# Altium footprint library DipComponent.PcbLib: 303 footprints (part 5 of 19)
Each footprint in its own frame and in the unit in brackets; x right, y up, seen from the top. Pads: shape width x height; smd on the part's side, far side on the other; paste and mask are expansions set on the pad; w line width, h text height; cw(c..) or ccw(c..) is an arc to the next point about the centre after c.
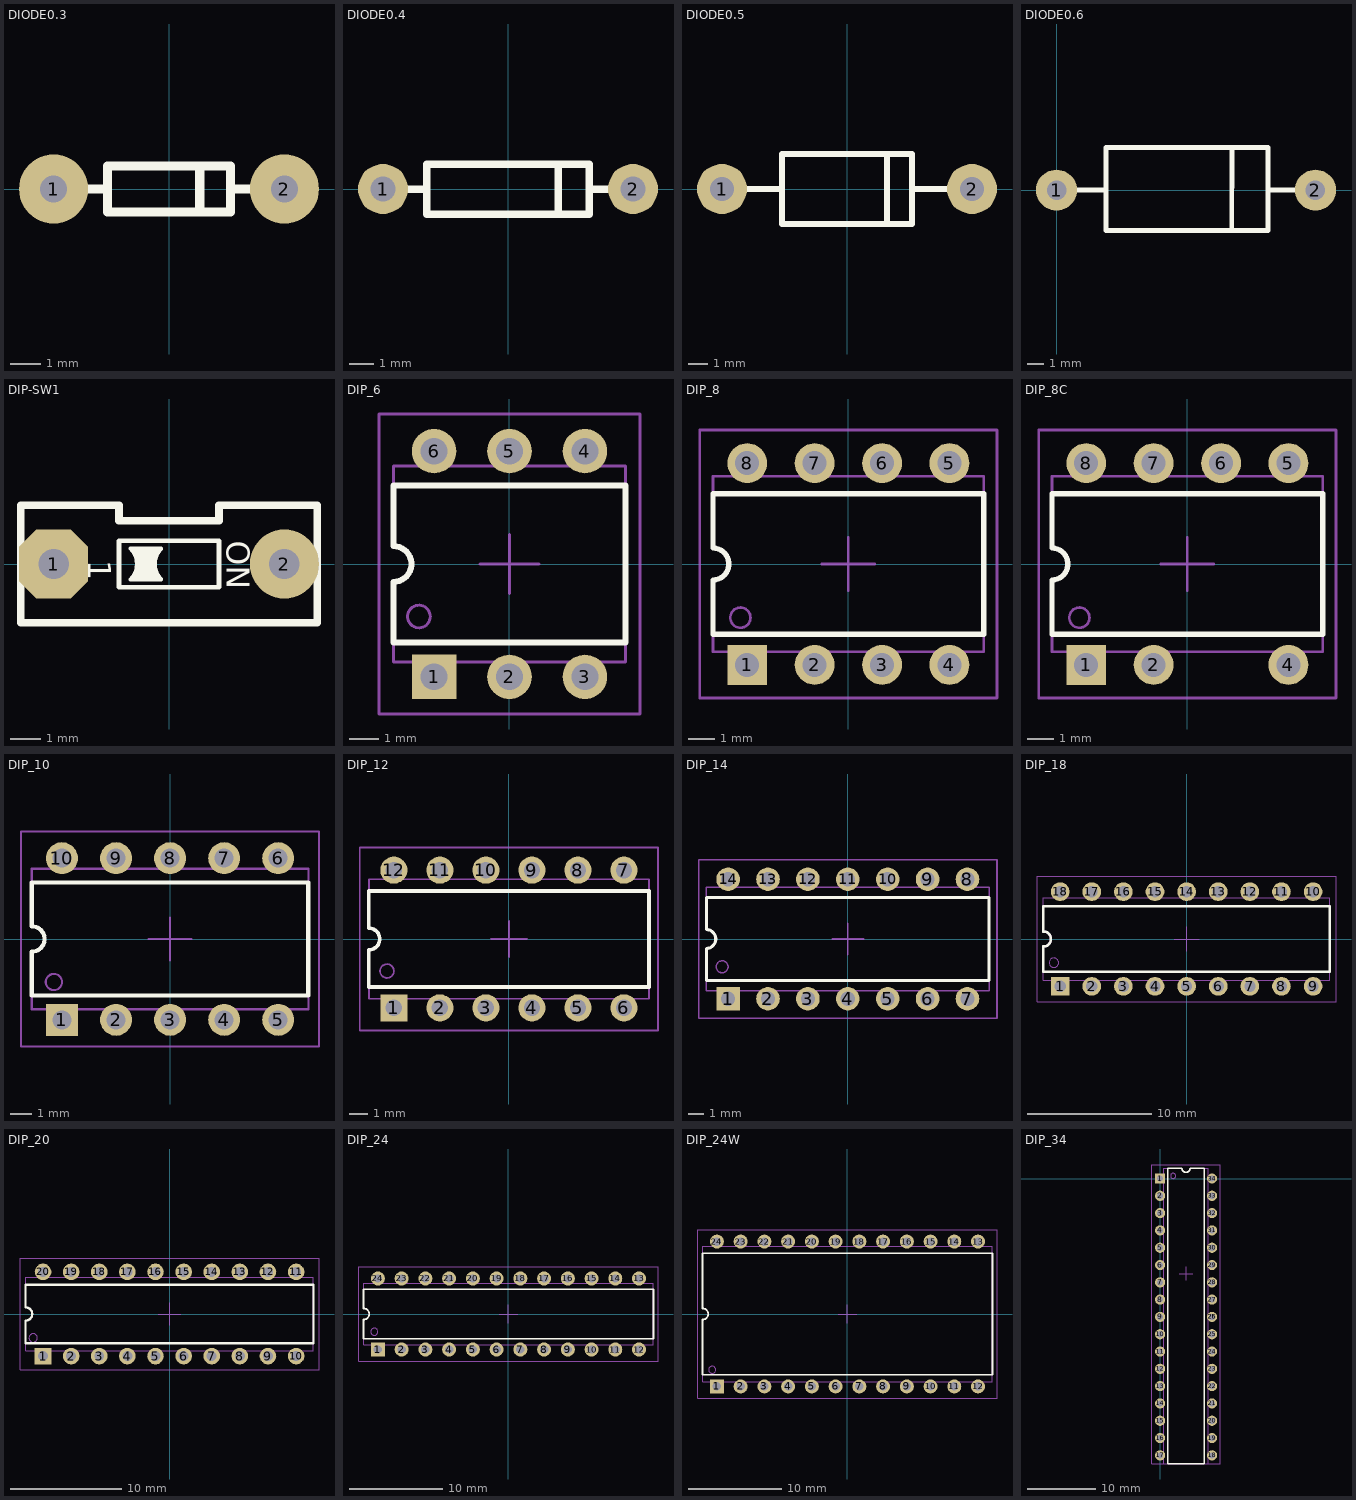
[diagram p4: the footprints below, top view; thin cyan lines are the x and y axes]

## DIODE0.3 [mil]
pads (2):
  round 90 hole 35.43: 1(-150,0) 2(150,0)
Top Overlay:
  lines w12: -110,0 -80,0 ; 40,-30 40,30 ; 80,0 110,0 ; -80,-30 -80,30 80,30 80,-30 -80,-30

## DIODE0.4 [mil]
pads (2):
  round 80 hole 39.37: 1(-200,0) 2(200,0)
Top Overlay:
  lines w12: -160,0 -130,0 ; 80,-40 80,40 ; 130,0 160,0 ; -130,-40 130,-40 130,40 -130,40 -130,-40

## DIODE0.5 [mm]
pads (2):
  round 2.54 hole 1.2: 1(-6.35,0) 2(6.35,0)
Top Overlay:
  lines w0.305: -5.207,0 -3.302,0 ; 2.032,-1.778 2.032,1.778 ; 3.302,0 5.207,0 ; -3.302,-1.778 -3.302,1.778 3.302,1.778 3.302,-1.778 -3.302,-1.778
3D body "Diod DO-201AD Horizontal.STEP": height 5.8, standoff -3.3, extent -7.589,-2.811 7.701,2.799

## DIODE0.6 [mm]
pads (2):
  round 2.54 hole 1.2: 1(0,0) 2(16,0)
Top Overlay:
  lines w0.305: 1.143,0 3.048,0 ; 10.829,-2.461 10.83,2.64 ; 13.091,0 16,0 ; 3.048,-2.499 13.072,-2.499 13.072,2.632 3.048,2.632 3.048,-2.499
3D body "Diod DO-201AD Horizontal.STEP": height 5.8, standoff -3.3, extent 0.386,-2.862 15.676,2.748

## DIP-SW1 [mil]
pads (2):
  oct 90x90 hole 39.37: 1(-150,0)
  round 90 hole 39.37: 2(150,0)
Top Overlay:
  lines w5: -31,-9 -29,4 -32,8 -25,8 -29,-3 -25,-10 -35,-10 -31,0 -36,11 -21,11 -26,-1 -20,-13 -40,-13 -34,2 -41,14 -17,14 -22,-1 -16,-17 -44,-17 -38,3 -45,17 -14,17 ; -50,-20 ccw(c-70,0) -50,20 -10,20 ccw(c10,0) -10,-20 -50,-20
  lines w6: -64.96,-30 -64.96,30 64.96,30 64.96,-30 -64.96,-30
  lines w10: -192.91,-76.38 192.91,-76.38 192.91,76.38 64.96,76.38 64.96,56.38 -64.96,56.38 -64.96,76.38 -192.91,76.38 -192.91,-76.38
  text "ON" at 75,30 h30
  text "1" at -105,5 h30

## DIP_6 [mm] "DIP6"
height 5.06
pads (6):
  rect 1.5x1.5 hole 0.9: 1(-2.54,-3.8)
  round 1.5 hole 0.9: 2(0,-3.8) 3(2.54,-3.8) 4(2.54,3.8) 5(0,3.8) 6(-2.54,3.8)
Top Overlay:
  lines w0.2: -3.9,-2.65 -3.9,-0.6 ccw(c-3.9,0) -3.9,0.6 -3.9,2.65 3.9,2.65 3.9,-2.65 -3.9,-2.65
Mechanical 13:
  circle w0.1: c-3.048,-1.768 r0.381
  lines w0.1: -3.9,-3.3 3.9,-3.3 3.9,3.3 -3.9,3.3 -3.9,0.6 cw(c-3.9,0) -3.9,-0.6 -3.9,-3.3
Mechanical 15:
  lines w0.1: -1,0 1,0 ; 0,-1 0,1 ; -4.4,-5.05 4.4,-5.05 4.4,5.05 -4.4,5.05 -4.4,-5.05
3D body: height 5.06, standoff 0, extent -3.9,-3.3 3.9,3.3

## DIP_8 [mm] "Dual-In-line Package,300mil body;8 pin"
height 5.06
pads (8):
  rect 1.5x1.5 hole 0.9: 1(-3.81,-3.8)
  round 1.5 hole 0.9: 2(-1.27,-3.8) 3(1.27,-3.8) 4(3.81,-3.8) 5(3.81,3.8) 6(1.27,3.8) 7(-1.27,3.8) 8(-3.81,3.8)
Top Overlay:
  lines w0.2: -5.1,-2.65 5.1,-2.65 5.1,2.65 -5.1,2.65 -5.1,0.6 cw(c-5.1,0) -5.1,-0.6 -5.1,-2.65
Mechanical 13:
  circle w0.1: c-4.064,-2.022 r0.381
  lines w0.1: -5.1,-3.3 -5.1,-0.6 ccw(c-5.1,0) -5.1,0.6 -5.1,3.3 5.1,3.3 5.1,-3.3 -5.1,-3.3
Mechanical 15:
  lines w0.1: -1,0 1,0 ; 0,-1 0,1 ; -5.6,-5.05 5.6,-5.05 5.6,5.05 -5.6,5.05 -5.6,-5.05
3D body: height 5.06, standoff 0, extent -5.1,-3.3 5.1,3.3

## DIP_8C [mm] "Dual-In-line Package,300mil body;8 pin"
height 5.06
pads (7):
  rect 1.5x1.5 hole 0.9: 1(-3.81,-3.8)
  round 1.5 hole 0.9: 2(-1.27,-3.8) 4(3.81,-3.8) 5(3.81,3.8) 6(1.27,3.8) 7(-1.27,3.8) 8(-3.81,3.8)
Top Overlay:
  lines w0.2: -5.1,-2.65 -5.1,-0.6 ccw(c-5.1,0) -5.1,0.6 -5.1,2.65 5.1,2.65 5.1,-2.65 -5.1,-2.65
Mechanical 13:
  circle w0.1: c-4.064,-2.022 r0.381
  lines w0.1: -5.1,-3.3 5.1,-3.3 5.1,3.3 -5.1,3.3 -5.1,0.6 cw(c-5.1,0) -5.1,-0.6 -5.1,-3.3
Mechanical 15:
  lines w0.1: -1,0 1,0 ; 0,-1 0,1 ; -5.6,-5.05 -5.6,5.05 5.6,5.05 5.6,-5.05 -5.6,-5.05
3D body: height 5.06, standoff 0, extent -5.1,-3.3 5.1,3.3

## DIP_10 [mm] "Dual-In-line Package,300mil body;10 pin"
height 5.06
pads (10):
  rect 1.5x1.5 hole 0.9: 1(-5.08,-3.8)
  round 1.5 hole 0.9: 2(-2.54,-3.8) 3(0,-3.8) 4(2.54,-3.8) 5(5.08,-3.8) 6(5.08,3.8) 7(2.54,3.8) 8(0,3.8) 9(-2.54,3.8) 10(-5.08,3.8)
Top Overlay:
  lines w0.2: -6.5,-2.65 -6.5,-0.6 ccw(c-6.5,0) -6.5,0.6 -6.5,2.65 6.5,2.65 6.5,-2.65 -6.5,-2.65
Mechanical 13:
  circle w0.1: c-5.461,-2.022 r0.381
  lines w0.1: -6.5,-3.3 6.5,-3.3 6.5,3.3 -6.5,3.3 -6.5,0.6 cw(c-6.5,0) -6.5,-0.6 -6.5,-3.3
Mechanical 15:
  lines w0.1: -1,0 1,0 ; 0,-1 0,1 ; -7,-5.05 7,-5.05 7,5.05 -7,5.05 -7,-5.05
3D body: height 5.06, standoff 0, extent -6.5,-3.3 6.5,3.3

## DIP_12 [mm] "Dual-In-line Package,300mil body;12 pin"
height 5.06
pads (12):
  rect 1.5x1.5 hole 0.9: 1(-6.35,-3.8)
  round 1.5 hole 0.9: 2(-3.81,-3.8) 3(-1.27,-3.8) 4(1.27,-3.8) 5(3.81,-3.8) 6(6.35,-3.8) 7(6.35,3.8) 8(3.81,3.8) 9(1.27,3.8) 10(-1.27,3.8) 11(-3.81,3.8) 12(-6.35,3.8)
Top Overlay:
  lines w0.2: -7.73,-2.65 7.73,-2.65 7.73,2.65 -7.73,2.65 -7.73,0.6 cw(c-7.73,0) -7.73,-0.6 -7.73,-2.65
Mechanical 13:
  circle w0.1: c-6.731,-1.768 r0.381
  lines w0.1: -7.73,-3.3 -7.73,-0.6 ccw(c-7.73,0) -7.73,0.6 -7.73,3.3 7.73,3.3 7.73,-3.3 -7.73,-3.3
Mechanical 15:
  lines w0.1: -1,0 1,0 ; 0,-1 0,1 ; -8.23,-5.05 8.23,-5.05 8.23,5.05 -8.23,5.05 -8.23,-5.05
3D body: height 5.06, standoff 0, extent -7.73,-3.3 7.73,3.3

## DIP_14 [mm] "Dual-In-line Package,300mil body;14 pin"
height 5.06
pads (14):
  rect 1.5x1.5 hole 0.9: 1(-7.62,-3.8)
  round 1.5 hole 0.9: 2(-5.08,-3.8) 3(-2.54,-3.8) 4(0,-3.8) 5(2.54,-3.8) 6(5.08,-3.8) 7(7.62,-3.8) 8(7.62,3.8) 9(5.08,3.8) 10(2.54,3.8) 11(0,3.8) 12(-2.54,3.8) 13(-5.08,3.8) 14(-7.62,3.8)
Top Overlay:
  lines w0.2: -9,-2.65 9,-2.65 9,2.65 -9,2.65 -9,0.6 cw(c-9,0) -9,-0.6 -9,-2.65
Mechanical 13:
  circle w0.1: c-8.001,-1.768 r0.381
  lines w0.1: -9,-3.3 -9,-0.6 ccw(c-9,0) -9,0.6 -9,3.3 9,3.3 9,-3.3 -9,-3.3
Mechanical 15:
  lines w0.1: -1,0 1,0 ; 0,-1 0,1 ; -9.5,-5.05 9.5,-5.05 9.5,5.05 -9.5,5.05 -9.5,-5.05
3D body: height 5.06, standoff 0, extent -9,-3.3 9,3.3

## DIP_18 [mm] "Dual-In-line Package,300mil body;18 pin"
height 5.06
pads (18):
  rect 1.5x1.5 hole 0.9: 1(-10.16,-3.8)
  round 1.5 hole 0.9: 2(-7.62,-3.8) 3(-5.08,-3.8) 4(-2.54,-3.8) 5(0,-3.8) 6(2.54,-3.8) 7(5.08,-3.8) 8(7.62,-3.8) 9(10.16,-3.8) 10(10.16,3.8) 11(7.62,3.8) 12(5.08,3.8) 13(2.54,3.8) 14(0,3.8) 15(-2.54,3.8) 16(-5.08,3.8) 17(-7.62,3.8) 18(-10.16,3.8)
Top Overlay:
  lines w0.2: -11.5,-2.65 11.5,-2.65 11.5,2.65 -11.5,2.65 -11.5,0.6 cw(c-11.5,0) -11.5,-0.6 -11.5,-2.65
Mechanical 13:
  circle w0.1: c-10.668,-1.905 r0.381
  lines w0.1: -11.5,-0.6 -11.5,-3.3 11.5,-3.3 11.5,3.3 -11.5,3.3 -11.5,0.6
  lines w0.2: -11.5,-0.6 ccw(c-11.5,0) -11.5,0.6
Mechanical 15:
  lines w0.1: -1,0 1,0 ; 0,-1 0,1 ; -12,-5.05 -12,5.05 12,5.05 12,-5.05 -12,-5.05
3D body: height 5.06, standoff 0, extent -11.5,-3.3 11.5,3.3

## DIP_20 [mm] "Dual-In-line Package,300mil body;20 pin"
height 5.06
pads (20):
  rect 1.5x1.5 hole 0.9: 1(-11.43,-3.8)
  round 1.5 hole 0.9: 2(-8.89,-3.8) 3(-6.35,-3.8) 4(-3.81,-3.8) 5(-1.27,-3.8) 6(1.27,-3.8) 7(3.81,-3.8) 8(6.35,-3.8) 9(8.89,-3.8) 10(11.43,-3.8) 11(11.43,3.8) 12(8.89,3.8) 13(6.35,3.8) 14(3.81,3.8) 15(1.27,3.8) 16(-1.27,3.8) 17(-3.81,3.8) 18(-6.35,3.8) 19(-8.89,3.8) 20(-11.43,3.8)
Top Overlay:
  lines w0.2: -13,-2.65 -13,-0.6 ccw(c-13,0) -13,0.6 -13,2.65 13,2.65 13,-2.65 -13,-2.65
Mechanical 13:
  circle w0.1: c-12.319,-2.159 r0.381
  lines w0.1: -13,-3.3 -13,-0.6 ccw(c-13,0) -13,0.6 -13,3.3 13,3.3 13,-3.3 -13,-3.3
Mechanical 15:
  lines w0.1: -1,0 1,0 ; 0,-1 0,1 ; -13.5,-5.05 13.5,-5.05 13.5,5.05 -13.5,5.05 -13.5,-5.05
3D body: height 5.06, standoff 0, extent -13,-3.3 13,3.3

## DIP_24 [mm] "Dual-In-line Package,300mil body;24 pin"
height 5.06
pads (24):
  rect 1.5x1.5 hole 0.9: 1(-13.97,-3.8)
  round 1.5 hole 0.9: 2(-11.43,-3.8) 3(-8.89,-3.8) 4(-6.35,-3.8) 5(-3.81,-3.8) 6(-1.27,-3.8) 7(1.27,-3.8) 8(3.81,-3.8) 9(6.35,-3.8) 10(8.89,-3.8) 11(11.43,-3.8) 12(13.97,-3.8) 13(13.97,3.8) 14(11.43,3.8) 15(8.89,3.8) 16(6.35,3.8) 17(3.81,3.8) 18(1.27,3.8) 19(-1.27,3.8) 20(-3.81,3.8) 21(-6.35,3.8) 22(-8.89,3.8) 23(-11.43,3.8) 24(-13.97,3.8)
Top Overlay:
  lines w0.2: -15.5,-2.65 15.5,-2.65 15.5,2.65 -15.5,2.65 -15.5,0.6 cw(c-15.5,0) -15.5,-0.6 -15.5,-2.65
Mechanical 13:
  circle w0.1: c-14.351,-1.895 r0.381
  lines w0.1: -15.5,-3.3 -15.5,-0.6 ccw(c-15.5,0) -15.5,0.6 -15.5,3.3 15.5,3.3 15.5,-3.3 -15.5,-3.3
Mechanical 15:
  lines w0.1: -1,0 1,0 ; 0,-1 0,1 ; -16,-5.05 -16,5.05 16,5.05 16,-5.05 -16,-5.05
3D body: height 5.06, standoff 0, extent -15.5,-3.3 15.5,3.3

## DIP_24W [mm] "Dual-In-line Package,600mil body;24 pin"
height 5.06
pads (24):
  rect 1.5x1.5 hole 0.9: 1(-13.97,-7.75)
  round 1.5 hole 0.9: 2(-11.43,-7.75) 3(-8.89,-7.75) 4(-6.35,-7.75) 5(-3.81,-7.75) 6(-1.27,-7.75) 7(1.27,-7.75) 8(3.81,-7.75) 9(6.35,-7.75) 10(8.89,-7.75) 11(11.43,-7.75) 12(13.97,-7.75) 13(13.97,7.75) 14(11.43,7.75) 15(8.89,7.75) 16(6.35,7.75) 17(3.81,7.75) 18(1.27,7.75) 19(-1.27,7.75) 20(-3.81,7.75) 21(-6.35,7.75) 22(-8.89,7.75) 23(-11.43,7.75) 24(-13.97,7.75)
Top Overlay:
  lines w0.2: -15.5,-6.5 -15.5,-0.6 ccw(c-15.5,0) -15.5,0.6 -15.5,6.5 15.5,6.5 15.5,-6.5 -15.5,-6.5
Mechanical 13:
  circle w0.1: c-14.478,-5.969 r0.381
  lines w0.1: -15.5,-7.25 15.5,-7.25 15.5,7.25 -15.5,7.25 -15.5,0.6 cw(c-15.5,0) -15.5,-0.6 -15.5,-7.25
Mechanical 15:
  lines w0.1: -1,0 1,0 ; 0,-1 0,1 ; -16,-9 16,-9 16,9 -16,9 -16,-9
3D body: height 5.06, standoff 0, extent -15.5,-7.25 15.5,7.25

## DIP_34 [mm] "Dual-In-line Package,300mil body;24 pin"
height 5.06
pads (35):
  rect 1.5x1.5 hole 0.9: 1(0,0)
  round 1.5 hole 0.9: 2(0,-2.54) 3(0,-5.08) 4(0,-7.62) 5(0,-10.16) 6(0,-12.7) 7(0,-15.24) 8(0,-17.78) 9(0,-20.32) 10(0,-22.86) 11(0,-25.4) 12(0,-27.94) 13(0,-30.48) 14(0,-33.02) 15(0,-35.56) 16(0,-38.1) 17(0,-40.64) 18(7.62,-40.64) 19(7.62,-38.1) 20(7.62,-35.56) 21(7.62,-33.02) 22(7.62,-30.48) 23(7.62,-27.94) 24(7.62,-25.4) 25(7.62,-22.86) 25(7.62,-20.32) 26(7.62,-20.32) 27(7.62,-17.78) 28(7.62,-15.24) 29(7.62,-12.7) 30(7.62,-10.16) 31(7.62,-7.62) 32(7.62,-5.08) 33(7.62,-2.54) 34(7.62,0)
Top Overlay:
  lines w0.2: 1.15,-41.91 1.15,1.53 3.2,1.53 ccw(c3.8,1.53) 4.4,1.53 6.45,1.53 6.45,-41.91 1.15,-41.91
Mechanical 13:
  circle w0.1: c1.905,0.381 r0.381
  lines w0.1: 0.5,-41.91 7.1,-41.91 7.1,1.53 4.4,1.53 cw(c3.8,1.53) 3.2,1.53 0.5,1.53 0.5,-41.91
Mechanical 15:
  lines w0.1: 2.8,-13.97 4.8,-13.97 ; 3.8,-14.97 3.8,-12.97 ; -1.25,-41.91 8.85,-41.91 8.85,2.03 -1.25,2.03 -1.25,-41.91
3D body: height 5.06, standoff 0, extent 0.5,-41.91 7.1,1.53